# Altium schematic symbol library Sang_library.SchLib: 1607 symbols (part 12 of 15) (continued)
## STM32F103RDT6 - LQFP64 (continued)

## STM32F103RDT6 - LQFP64_1
designator STM?, comment STM32F103RDT6
Dán; Ma_Hang: MH004910; Ten_Linh_Kien: STM32F103RDT6 LQFP64; Don_Vi: Con; Kieu_Chan: *; Ghi_Chu: *; Chung_Loai: Dán
pins: 1 VBAT, 2 PC13/TAMPERRTC, 3 PC14/OSC32_IN[OSC32_IN], 4 PC15OSC32_OUT[OSC32_OUT], 5 OSC_IN, 6 OSC_OUT, 7 NRST, 8 PC0/ADC123_IN10, 9 PC1/ADC123_IN11, 10 PC2/ ADC123_IN12, 11 PC3/ADC123_IN13, 12 VSSA, 13 VDDA, 14 PA0-WKUP/WKUP/USART2_CTS/ADC123_IN0/TIM2_CH1_ETR/TIM5_CH1/TIM8_ETR, 15 PA1/USART2_RTS/ADC123_IN1/TIM5_CH2/TIM2_CH2, 16 PA2/USART2_TX(9)/TIM5_CH3/ADC123_IN2/TIM2_CH3, 17 PA3/USART2_RX/TIM5_CH4/ADC123_IN3/TIM2_CH4, 18 VSS_4, 19 VDD_4, 20 PA4/SPI1_NSS/USART2_CK/DAC_OUT1/ADC12_IN4, 21 PA5/SPI1_SCK/DAC_OUT2 ADC12_IN5 , 22 PA6/SPI1_MISO/TIM8_BKIN/ADC12_IN6/TIM3_CH1[TIM1_BKIN], 23 PA7/SPI1_MOSI/TIM8_CH1N/ADC12_IN7/TIM3_CH2[TIM1_CH1N], 24 PC4/ ADC12_IN14 , 25 PC5/ ADC12_IN15 , 26 PB0/ADC12_IN8/TIM3_CH3/TIM8_CH2N[TIM1_CH2N], 27 PB1/ADC12_IN9/TIM3_CH4/TIM8_CH3N[TIM1_CH3N], 28 PB2/BOOT1, 29 PB10/I2C2_SCL/USART3_TX[TIM2_CH3], 30 PB11/I2C2_SDA/USART3_RX[TIM2_CH4], 31 VSS_1, 32 VDD_1, 33 PB12/SPI2_NSS/I2S2_WS/I2C2_SMBA/USART3_CK/TIM1_BKIN, 34 PB13/SPI2_SCK/I2S2_CK/USART3_CTS/TIM1_CH1N, 35 PB14/SPI2_MISO/TIM1_CH2N/USART3_RTS, 36 PB15/SPI2_MOSI/I2S2_SD/TIM1_CH3N, 37 PC6/I2S2_MCK/TIM8_CH1/SDIO_D6[TIM3_CH1], 38 PC7/I2S3_MCK/TIM8_CH2/SDIO_D7[TIM3_CH2], 39 PC8/TIM8_CH3/SDIO_D0[TIM3_CH3], 40 PC9/ TIM8_CH4/SDIO_D1[TIM3_CH4], 41 PA8/USART1_CK/TIM1_CH1/MCO, 42 PA9/USART1_TX/TIM1_CH2, 43 PA10/USART1_RX/TIM1_CH3, 44 PA11/USART1_CTS/USBDM/CAN_RX/TIM1_CH4, 45 PA12/USART1_RTS/USBDP/CAN_TX/TIM1_ETR, 46 PA13/JTMSSWDIO[ PA13], 47 VSS_2, 48 VDD_2, 49 PA14/JTCKSWCLK[ PA14], 50 PA15/SPI3_NSS/I2S3_WS[TIM2_CH1_ETRPA15 / SPI1_NSS], 51 PC10/ UART4_TX/SDIO_D2[ USART3_TX], 52 PC11/UART4_RX/SDIO_D3[ USART3_RX], 53 PC12/ UART5_TX/SDIO_CK[ USART3_CK], 54 PD2/TIM3_ETR/UART5_RX/SDIO_CMD, 55 PB3/SPI3_SCK / I2S3_CK[PB3/TRACESWOTIM2_CH2 /SPI1_SCK], 56 PB4/ SPI3_MISO[PB4 / TIM3_CH1SPI1_MISO], 57 PB5/I2C1_SMBA/ SPI3_MOSI/I2S3_SD[TIM3_CH2 /SPI1_MOSI], 58 PB6/ I2C1_SCL/ TIM4_CH1[USART1_TX], 59 PB7/I2C1_SDA/FSMC_NADV /TIM4_CH2[USART1_RX], 60 BOOT0, 61 PB8/TIM4_CH3/SDIO_D4[I2C1_SCL/CAN_RX], 62 PB9/TIM4_CH4/SDIO_D5[I2C1_SDA /CAN_TX], 63 VSS_3, 64 VDD_3

## STM32F103T6U6
designator U?
STM32 ARM-based 32-bit MCU with 32 Kbytes Flash, 36-pin VFQFPN, Industrial Temperature; Published: 30-May-2008; DatasheetVersion: rev6, Mar-2008; PackageVersion: Mar-2008; PackageReference: VFQN36; Publisher: Altium Limited; PackageDescription: 36-Pin Quad Flat No-Lead, 6 x 6 X 1.0 mm Body, 0.5 mm Pitch, Exposed Pad (VFQN36); ComponentLink1Description: Manufacturer Link; ComponentLink1URL: www.st.com/stm32; ComponentLink2Description: Datasheet; ComponentLink2URL: http://www.st.com/stonline/products/literature/ds/13587.pdf
footprint QFN36 (QFN, 36-Leads, Body 6x6mm, Pitch 0.5mm, IPC High Density)
pins: 1 VDD_3 (power), 2 OSC_IN/PD0 (in), 3 OSC_OUT/PD1 (out), 4 NRST (io), 5 VSSA (power), 6 VDDA (power), 7 PA0-WKUP (io), 8 PA1 (io), 9 PA2 (io), 10 PA3 (io), 11 PA4 (io), 12 PA5 (io), 13 PA6 (io), 14 PA7 (io), 15 PB0 (io), 16 PB1 (io), 17 PB2/BOOT1 (io), 18 VSS_1 (power), 19 VDD_1 (power), 20 PA8 (io), 21 PA9 (io), 22 PA10 (io), 23 PA11 (io), 24 PA12 (io), 25 PA13/JTMS/SWDIO (io), 26 VSS_2 (power), 27 VDD_2 (power), 28 PA14/JTCK/SWCLK (io), 29 PA15/JTDI (io), 30 PB3/JTDO (io), 31 PB4/JNTRST (io), 32 PB5 (io), 33 PB6 (io), 34 PB7 (io), 35 BOOT0 (in), 36 VSS_3 (power)

## STM32F103VBH6
designator U?
STM32 ARM-based 32-bit MCU with 128 Kbytes Flash, 100-pin BGA, Industrial Temperature; Published: 30-May-2008; DatasheetVersion: rev6, Mar-2008; PackageVersion: Mar-2008; PackageReference: LFBGA100; Publisher: Altium Limited; PackageDescription: 100-Ball Low Profile Fine Pitch BGA, 10 x 10 x 1.7 mm Body, 0.8 mm Pitch (LFBGA100); ComponentLink1Description: Manufacturer Link; ComponentLink1URL: www.st.com/stm32; ComponentLink2Description: Datasheet; ComponentLink2URL: http://www.st.com/stonline/products/literature/ds/13587.pdf
footprint BGA100 (BGA, 100-Leads, Body 9x9mm, Pitch 0.8mm)
pins: A1 PC14-OSC32_IN (io), A2 PC13-TAMPER-RTC (io), A3 PE2 (io), A4 PB9 (io), A5 PB7 (io), A6 PB4/JNTRST (io), A7 PB3/JTDO (io), A8 PA15/JTDI (io), A9 PA14/JTCK/SWCLK (io), A10 PA13/JTMS/SWDIO (io), B1 PC15-OSC32_OUT (io), B2 VBAT (power), B3 PE3 (io), B4 PB8 (io), B5 PB6 (io), B6 PD5 (io), B7 PD2 (io), B8 PC11 (io), B9 PC10 (io), B10 PA12 (io), C1 OSC_IN (in), C2 VSS_5 (power), C3 PE4 (io), C4 PE1 (io), C5 PB5 (io), C6 PD6 (io), C7 PD3 (io), C8 PC12 (io), C9 PA9 (io), C10 PA11 (io), D1 OSC_OUT (out), D2 VDD_5 (power), D3 PE5 (io), D4 PE0 (io), D5 BOOT0 (in), D6 PD7 (io), D7 PD4 (io), D8 PD0 (io), D9 PA8 (io), D10 PA10 (io), E1 NRST (io), E2 PC2 (io), E3 PE6 (io), E4 VSS_4 (power), E5 VSS_3 (power), E6 VSS_2 (power), E7 VSS_1 (power), E8 PD1 (io), E9 PC9 (io), E10 PC7 (io), F1 PC0 (io), F2 PC1 (io), F3 PC3 (io), F4 VDD_4 (power), F5 VDD_3 (power), F6 VDD_2 (power), F7 VDD_1 (power), F8 NC, F9 PC8 (io), F10 PC6 (io), G1 VSSA (power), G2 PA0-WKUP (io), G3 PA4 (io), G4 PC4 (io), G5 PB2/BOOT1 (io), G6 PE10 (io), G7 PE14 (io), G8 PB15 (io), G9 PD11 (io), G10 PD15 (io), H1 VREF- (power), H2 PA1 (io), H3 PA5 (io), H4 PC5 (io), H5 PE7 (io), H6 PE11 (io), H7 PE15 (io), H8 PB14 (io), H9 PD10 (io), H10 PD14 (io), J1 VREF+ (power), J2 PA2 (io), J3 PA6 (io), J4 PB0 (io), J5 PE8 (io), J6 PE12 (io), J7 PB10 (io), J8 PB13 (io), J9 PD9 (io), J10 PD13 (io), K1 VDDA (power), K2 PA3 (io), K3 PA7 (io), K4 PB1 (io), K5 PE9 (io), K6 PE13 (io), K7 PB11 (io), K8 PB12 (io), K9 PD8 (io), K10 PD12 (io)

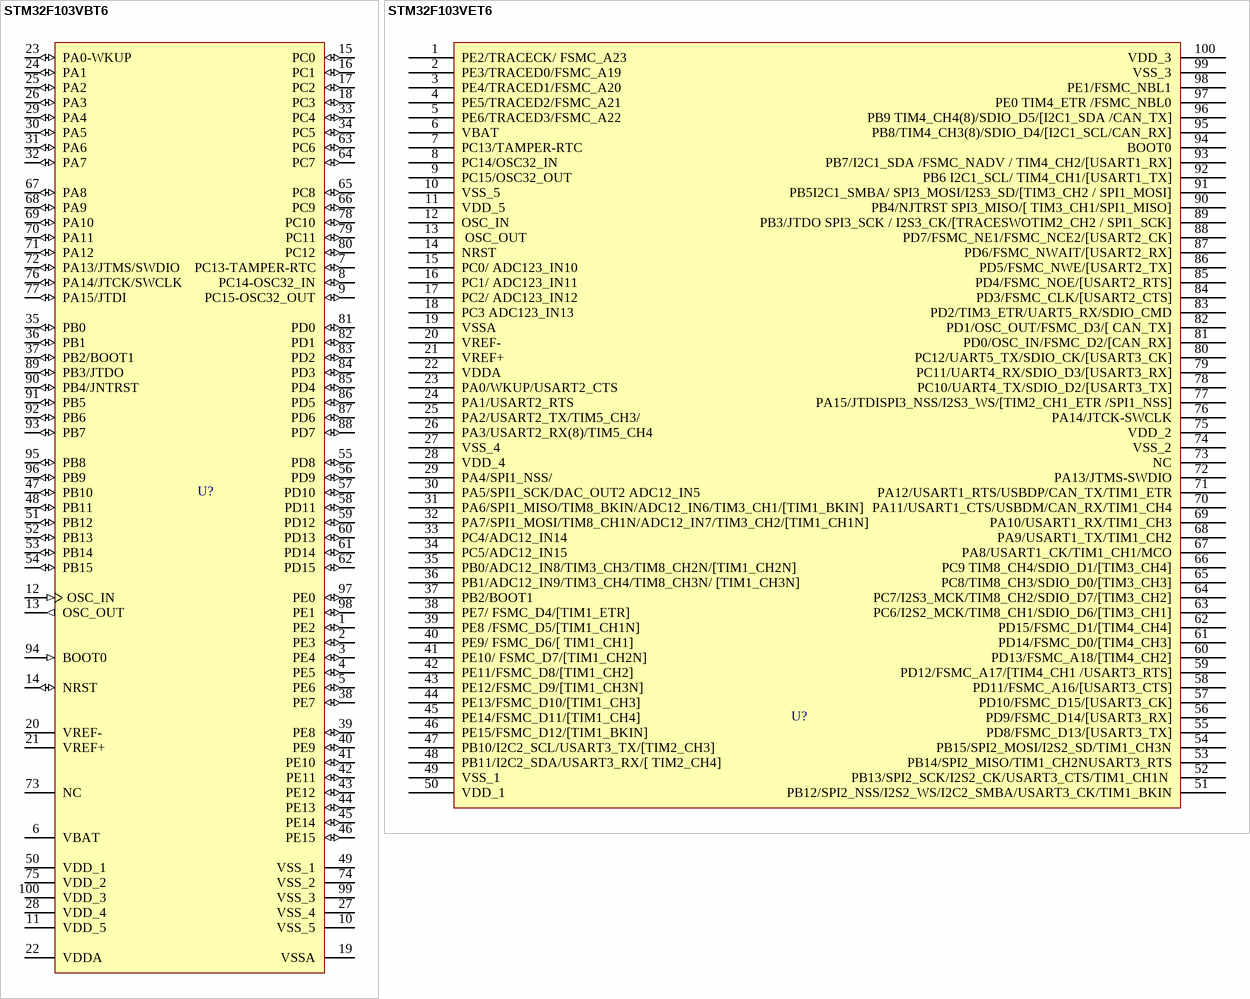
[diagram p80: symbols STM32F103VBT6 to STM32F103VET6]

## STM32F103VBT6
designator U?
STM32 ARM-based 32-bit MCU with 64 Kbytes Flash, 100-pin LQFP, Industrial Temperature; Published: 30-May-2008; DatasheetVersion: rev6, Mar-2008; PackageVersion: Mar-2008; PackageReference: LQFP100; Publisher: Altium Limited; PackageDescription: 100-Pin Low-Profile Quad Flat Pack, 14 x 14 mm Body, 0.5 mm Pitch (LQFP100); ComponentLink1Description: Manufacturer Link; ComponentLink1URL: www.st.com/stm32; ComponentLink2Description: Datasheet; ComponentLink2URL: http://www.st.com/stonline/products/literature/ds/13587.pdf
footprint TQFP100L (TQFP, 100-Leads, Body 14.00x14.00mm, Pitch 0.50mm, IPC High Density)
pins: 1 PE2 (io), 2 PE3 (io), 3 PE4 (io), 4 PE5 (io), 5 PE6 (io), 6 VBAT (power), 7 PC13-TAMPER-RTC (io), 8 PC14-OSC32_IN (io), 9 PC15-OSC32_OUT (io), 10 VSS_5 (power), 11 VDD_5 (power), 12 OSC_IN (in), 13 OSC_OUT (out), 14 NRST (io), 15 PC0 (io), 16 PC1 (io), 17 PC2 (io), 18 PC3 (io), 19 VSSA (power), 20 VREF- (power), 21 VREF+ (power), 22 VDDA (power), 23 PA0-WKUP (io), 24 PA1 (io), 25 PA2 (io), 26 PA3 (io), 27 VSS_4 (power), 28 VDD_4 (power), 29 PA4 (io), 30 PA5 (io), 31 PA6 (io), 32 PA7 (io), 33 PC4 (io), 34 PC5 (io), 35 PB0 (io), 36 PB1 (io), 37 PB2/BOOT1 (io), 38 PE7 (io), 39 PE8 (io), 40 PE9 (io), 41 PE10 (io), 42 PE11 (io), 43 PE12 (io), 44 PE13 (io), 45 PE14 (io), 46 PE15 (io), 47 PB10 (io), 48 PB11 (io), 49 VSS_1 (power), 50 VDD_1 (power), 51 PB12 (io), 52 PB13 (io), 53 PB14 (io), 54 PB15 (io), 55 PD8 (io), 56 PD9 (io), 57 PD10 (io), 58 PD11 (io), 59 PD12 (io), 60 PD13 (io), 61 PD14 (io), 62 PD15 (io), 63 PC6 (io), 64 PC7 (io), 65 PC8 (io), 66 PC9 (io), 67 PA8 (io), 68 PA9 (io), 69 PA10 (io), 70 PA11 (io), 71 PA12 (io), 72 PA13/JTMS/SWDIO (io), 73 NC, 74 VSS_2 (power), 75 VDD_2 (power), 76 PA14/JTCK/SWCLK (io), 77 PA15/JTDI (io), 78 PC10 (io), 79 PC11 (io), 80 PC12 (io), 81 PD0 (io), 82 PD1 (io), 83 PD2 (io), 84 PD3 (io), 85 PD4 (io), 86 PD5 (io), 87 PD6 (io), 88 PD7 (io), 89 PB3/JTDO (io), 90 PB4/JNTRST (io), 91 PB5 (io), 92 PB6 (io), 93 PB7 (io), 94 BOOT0 (in), 95 PB8 (io), 96 PB9 (io), 97 PE0 (io), 98 PE1 (io), 99 VSS_3 (power), 100 VDD_3 (power)

## STM32F103VET6
designator U?  (value not drawn)
Dán; Don_Vi: Con; Ma_Hang: MH001240; Ten_Linh_Kien: STM32F103VET6; Kieu_Chan: *; Ghi_Chu: *; Chung_Loai: Dán
footprint LQFP 100
pins: 1 PE2/TRACECK/ FSMC_A23, 2 PE3/TRACED0/FSMC_A19, 3 PE4/TRACED1/FSMC_A20, 4 PE5/TRACED2/FSMC_A21, 5 PE6/TRACED3/FSMC_A22, 6 VBAT, 7 PC13/TAMPER-RTC, 8 PC14/OSC32_IN, 9 PC15/OSC32_OUT, 10 VSS_5, 11 VDD_5, 12 OSC_IN, 13  OSC_OUT, 14 NRST, 15 PC0/ ADC123_IN10, 16 PC1/ ADC123_IN11, 17 PC2/ ADC123_IN12, 18 PC3 ADC123_IN13, 19 VSSA, 20 VREF-, 21 VREF+, 22 VDDA, 23 PA0/WKUP/USART2_CTS, 24 PA1/USART2_RTS, 25 PA2/USART2_TX/TIM5_CH3/, 26 PA3/USART2_RX(8)/TIM5_CH4, 27 VSS_4, 28 VDD_4, 29 PA4/SPI1_NSS/, 30 PA5/SPI1_SCK/DAC_OUT2 ADC12_IN5, 31 PA6/SPI1_MISO/TIM8_BKIN/ADC12_IN6/TIM3_CH1/[TIM1_BKIN], 32 PA7/SPI1_MOSI/TIM8_CH1N/ADC12_IN7/TIM3_CH2/[TIM1_CH1N], 33 PC4/ADC12_IN14 , 34 PC5/ADC12_IN15, 35 PB0/ADC12_IN8/TIM3_CH3/TIM8_CH2N/[TIM1_CH2N], 36 PB1/ADC12_IN9/TIM3_CH4/TIM8_CH3N/ [TIM1_CH3N], 37 PB2/BOOT1, 38 PE7/ FSMC_D4/[TIM1_ETR], 39 PE8 /FSMC_D5/[TIM1_CH1N], 40 PE9/ FSMC_D6/[ TIM1_CH1], 41 PE10/ FSMC_D7/[TIM1_CH2N], 42 PE11/FSMC_D8/[TIM1_CH2], 43 PE12/FSMC_D9/[TIM1_CH3N], 44 PE13/FSMC_D10/[TIM1_CH3], 45 PE14/FSMC_D11/[TIM1_CH4], 46 PE15/FSMC_D12/[TIM1_BKIN], 47 PB10/I2C2_SCL/USART3_TX/[TIM2_CH3], 48 PB11/I2C2_SDA/USART3_RX/[ TIM2_CH4], 49 VSS_1, 50 VDD_1, 51 PB12/SPI2_NSS/I2S2_WS/I2C2_SMBA/USART3_CK/TIM1_BKIN, 52 PB13/SPI2_SCK/I2S2_CK/USART3_CTS/TIM1_CH1N , 53 PB14/SPI2_MISO/TIM1_CH2NUSART3_RTS, 54 PB15/SPI2_MOSI/I2S2_SD/TIM1_CH3N, 55 PD8/FSMC_D13/[USART3_TX], 56 PD9/FSMC_D14/[USART3_RX], 57 PD10/FSMC_D15/[USART3_CK], 58 PD11/FSMC_A16/[USART3_CTS], 59 PD12/FSMC_A17/[TIM4_CH1 /USART3_RTS], 60 PD13/FSMC_A18/[TIM4_CH2], 61 PD14/FSMC_D0/[TIM4_CH3], 62 PD15/FSMC_D1/[TIM4_CH4], 63 PC6/I2S2_MCK/TIM8_CH1/SDIO_D6/[TIM3_CH1], 64 PC7/I2S3_MCK/TIM8_CH2/SDIO_D7/[TIM3_CH2], 65 PC8/TIM8_CH3/SDIO_D0/[TIM3_CH3], 66 PC9 TIM8_CH4/SDIO_D1/[TIM3_CH4], 67 PA8/USART1_CK/TIM1_CH1/MCO, 68 PA9/USART1_TX/TIM1_CH2, 69 PA10/USART1_RX/TIM1_CH3, 70 PA11/USART1_CTS/USBDM/CAN_RX/TIM1_CH4, 71 PA12/USART1_RTS/USBDP/CAN_TX/TIM1_ETR, 72 PA13/JTMS-SWDIO, 73 NC, 74 VSS_2, 75 VDD_2, 76 PA14/JTCK-SWCLK, 77 PA15/JTDISPI3_NSS/I2S3_WS/[TIM2_CH1_ETR /SPI1_NSS], 78 PC10/UART4_TX/SDIO_D2/[USART3_TX], 79 PC11/UART4_RX/SDIO_D3/[USART3_RX], 80 PC12/UART5_TX/SDIO_CK/[USART3_CK], 81 PD0/OSC_IN/FSMC_D2/[CAN_RX], 82 PD1/OSC_OUT/FSMC_D3/[ CAN_TX], 83 PD2/TIM3_ETR/UART5_RX/SDIO_CMD, 84 PD3/FSMC_CLK/[USART2_CTS], 85 PD4/FSMC_NOE/[USART2_RTS], 86 PD5/FSMC_NWE/[USART2_TX], 87 PD6/FSMC_NWAIT/[USART2_RX], 88 PD7/FSMC_NE1/FSMC_NCE2/[USART2_CK], 89 PB3/JTDO SPI3_SCK / I2S3_CK/[TRACESWOTIM2_CH2 / SPI1_SCK], 90 PB4/NJTRST SPI3_MISO/[ TIM3_CH1/SPI1_MISO], 91 PB5I2C1_SMBA/ SPI3_MOSI/I2S3_SD/[TIM3_CH2 / SPI1_MOSI], 92 PB6 I2C1_SCL/ TIM4_CH1/[USART1_TX], 93 PB7/I2C1_SDA /FSMC_NADV / TIM4_CH2/[USART1_RX], 94 BOOT0, 95 PB8/TIM4_CH3(8)/SDIO_D4/[I2C1_SCL/CAN_RX], 96 PB9 TIM4_CH4(8)/SDIO_D5/[I2C1_SDA /CAN_TX], 97 PE0 TIM4_ETR /FSMC_NBL0, 98 PE1/FSMC_NBL1, 99 VSS_3, 100 VDD_3

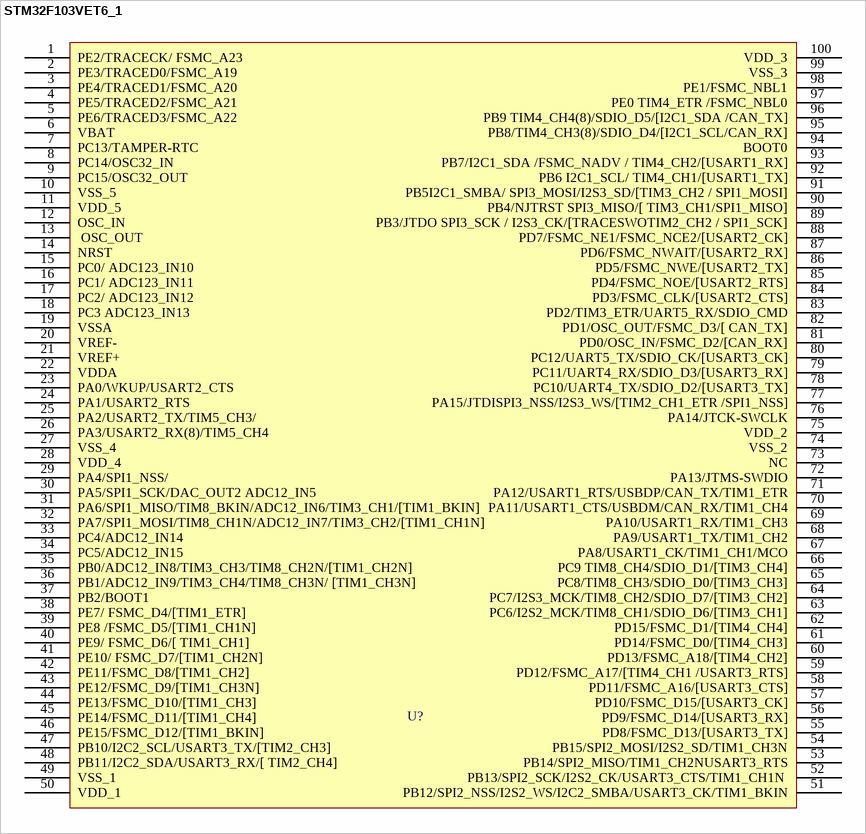
[diagram p81: symbol STM32F103VET6_1]

## STM32F103VET6_1
designator U?, comment STM32F103VET6  (value not drawn)
Dán; Don_Vi: Con; Ma_Hang: MH001240; Ten_Linh_Kien: STM32F103VET6; Kieu_Chan: *; Ghi_Chu: *; Chung_Loai: Dán
footprint LQFP 100
pins: 1 PE2/TRACECK/ FSMC_A23, 2 PE3/TRACED0/FSMC_A19, 3 PE4/TRACED1/FSMC_A20, 4 PE5/TRACED2/FSMC_A21, 5 PE6/TRACED3/FSMC_A22, 6 VBAT, 7 PC13/TAMPER-RTC, 8 PC14/OSC32_IN, 9 PC15/OSC32_OUT, 10 VSS_5, 11 VDD_5, 12 OSC_IN, 13  OSC_OUT, 14 NRST, 15 PC0/ ADC123_IN10, 16 PC1/ ADC123_IN11, 17 PC2/ ADC123_IN12, 18 PC3 ADC123_IN13, 19 VSSA, 20 VREF-, 21 VREF+, 22 VDDA, 23 PA0/WKUP/USART2_CTS, 24 PA1/USART2_RTS, 25 PA2/USART2_TX/TIM5_CH3/, 26 PA3/USART2_RX(8)/TIM5_CH4, 27 VSS_4, 28 VDD_4, 29 PA4/SPI1_NSS/, 30 PA5/SPI1_SCK/DAC_OUT2 ADC12_IN5, 31 PA6/SPI1_MISO/TIM8_BKIN/ADC12_IN6/TIM3_CH1/[TIM1_BKIN], 32 PA7/SPI1_MOSI/TIM8_CH1N/ADC12_IN7/TIM3_CH2/[TIM1_CH1N], 33 PC4/ADC12_IN14 , 34 PC5/ADC12_IN15, 35 PB0/ADC12_IN8/TIM3_CH3/TIM8_CH2N/[TIM1_CH2N], 36 PB1/ADC12_IN9/TIM3_CH4/TIM8_CH3N/ [TIM1_CH3N], 37 PB2/BOOT1, 38 PE7/ FSMC_D4/[TIM1_ETR], 39 PE8 /FSMC_D5/[TIM1_CH1N], 40 PE9/ FSMC_D6/[ TIM1_CH1], 41 PE10/ FSMC_D7/[TIM1_CH2N], 42 PE11/FSMC_D8/[TIM1_CH2], 43 PE12/FSMC_D9/[TIM1_CH3N], 44 PE13/FSMC_D10/[TIM1_CH3], 45 PE14/FSMC_D11/[TIM1_CH4], 46 PE15/FSMC_D12/[TIM1_BKIN], 47 PB10/I2C2_SCL/USART3_TX/[TIM2_CH3], 48 PB11/I2C2_SDA/USART3_RX/[ TIM2_CH4], 49 VSS_1, 50 VDD_1, 51 PB12/SPI2_NSS/I2S2_WS/I2C2_SMBA/USART3_CK/TIM1_BKIN, 52 PB13/SPI2_SCK/I2S2_CK/USART3_CTS/TIM1_CH1N , 53 PB14/SPI2_MISO/TIM1_CH2NUSART3_RTS, 54 PB15/SPI2_MOSI/I2S2_SD/TIM1_CH3N, 55 PD8/FSMC_D13/[USART3_TX], 56 PD9/FSMC_D14/[USART3_RX], 57 PD10/FSMC_D15/[USART3_CK], 58 PD11/FSMC_A16/[USART3_CTS], 59 PD12/FSMC_A17/[TIM4_CH1 /USART3_RTS], 60 PD13/FSMC_A18/[TIM4_CH2], 61 PD14/FSMC_D0/[TIM4_CH3], 62 PD15/FSMC_D1/[TIM4_CH4], 63 PC6/I2S2_MCK/TIM8_CH1/SDIO_D6/[TIM3_CH1], 64 PC7/I2S3_MCK/TIM8_CH2/SDIO_D7/[TIM3_CH2], 65 PC8/TIM8_CH3/SDIO_D0/[TIM3_CH3], 66 PC9 TIM8_CH4/SDIO_D1/[TIM3_CH4], 67 PA8/USART1_CK/TIM1_CH1/MCO, 68 PA9/USART1_TX/TIM1_CH2, 69 PA10/USART1_RX/TIM1_CH3, 70 PA11/USART1_CTS/USBDM/CAN_RX/TIM1_CH4, 71 PA12/USART1_RTS/USBDP/CAN_TX/TIM1_ETR, 72 PA13/JTMS-SWDIO, 73 NC, 74 VSS_2, 75 VDD_2, 76 PA14/JTCK-SWCLK, 77 PA15/JTDISPI3_NSS/I2S3_WS/[TIM2_CH1_ETR /SPI1_NSS], 78 PC10/UART4_TX/SDIO_D2/[USART3_TX], 79 PC11/UART4_RX/SDIO_D3/[USART3_RX], 80 PC12/UART5_TX/SDIO_CK/[USART3_CK], 81 PD0/OSC_IN/FSMC_D2/[CAN_RX], 82 PD1/OSC_OUT/FSMC_D3/[ CAN_TX], 83 PD2/TIM3_ETR/UART5_RX/SDIO_CMD, 84 PD3/FSMC_CLK/[USART2_CTS], 85 PD4/FSMC_NOE/[USART2_RTS], 86 PD5/FSMC_NWE/[USART2_TX], 87 PD6/FSMC_NWAIT/[USART2_RX], 88 PD7/FSMC_NE1/FSMC_NCE2/[USART2_CK], 89 PB3/JTDO SPI3_SCK / I2S3_CK/[TRACESWOTIM2_CH2 / SPI1_SCK], 90 PB4/NJTRST SPI3_MISO/[ TIM3_CH1/SPI1_MISO], 91 PB5I2C1_SMBA/ SPI3_MOSI/I2S3_SD/[TIM3_CH2 / SPI1_MOSI], 92 PB6 I2C1_SCL/ TIM4_CH1/[USART1_TX], 93 PB7/I2C1_SDA /FSMC_NADV / TIM4_CH2/[USART1_RX], 94 BOOT0, 95 PB8/TIM4_CH3(8)/SDIO_D4/[I2C1_SCL/CAN_RX], 96 PB9 TIM4_CH4(8)/SDIO_D5/[I2C1_SDA /CAN_TX], 97 PE0 TIM4_ETR /FSMC_NBL0, 98 PE1/FSMC_NBL1, 99 VSS_3, 100 VDD_3

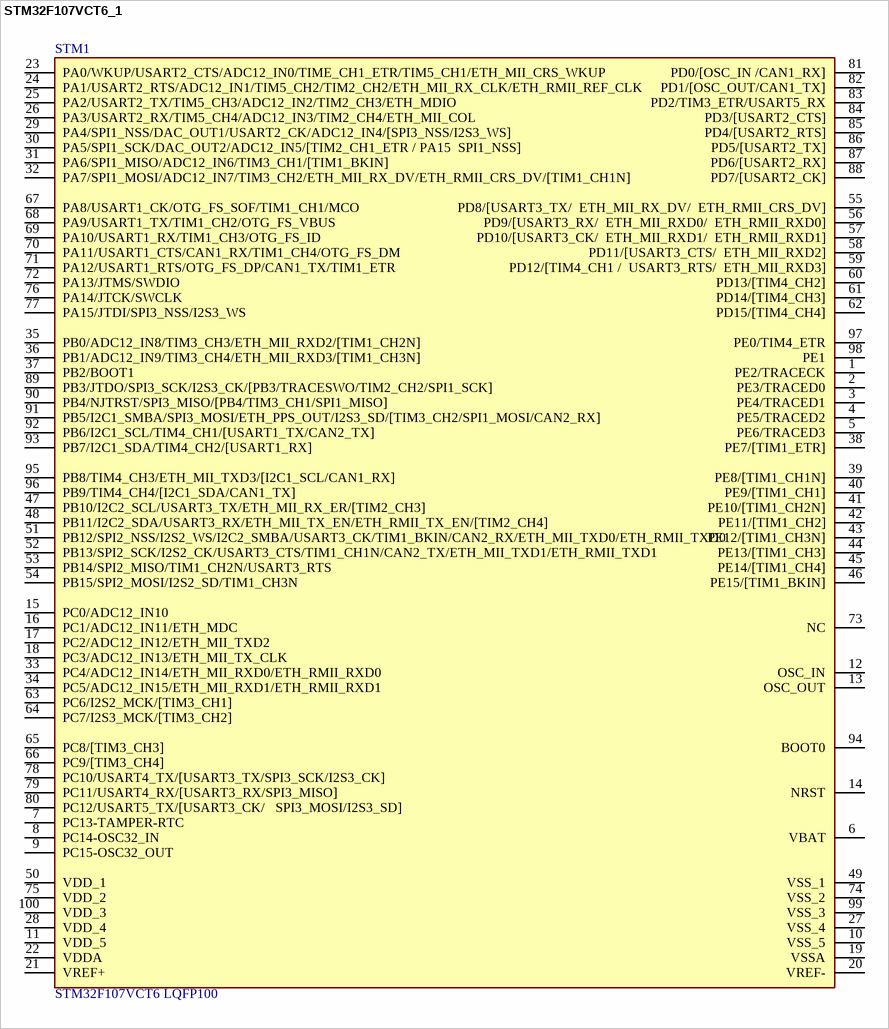
[diagram p82: symbol STM32F107VCT6_1]

## STM32F107VCT6_1
designator STM1, comment STM32F107VCT6 LQFP100
Dán; Don_Vi: Con; Ma_Hang: MH002437; Ten_Linh_Kien: STM32F107VCT6 LQFP100; Ghi_Chu: *; Kieu_Chan: *; Chung_Loai: Dán
footprint LQFP 100
pins: 1 PE2/TRACECK, 2 PE3/TRACED0, 3 PE4/TRACED1, 4 PE5/TRACED2, 5 PE6/TRACED3, 6 VBAT, 7 PC13-TAMPER-RTC, 8 PC14-OSC32_IN, 9 PC15-OSC32_OUT, 10 VSS_5, 11 VDD_5, 12 OSC_IN, 13 OSC_OUT, 14 NRST, 15 PC0/ADC12_IN10, 16 PC1/ADC12_IN11/ETH_MDC, 17 PC2/ADC12_IN12/ETH_MII_TXD2, 18 PC3/ADC12_IN13/ETH_MII_TX_CLK, 19 VSSA, 20 VREF-, 21 VREF+, 22 VDDA, 23 PA0/WKUP/USART2_CTS/ADC12_IN0/TIME_CH1_ETR/TIM5_CH1/ETH_MII_CRS_WKUP, 24 PA1/USART2_RTS/ADC12_IN1/TIM5_CH2/TIM2_CH2/ETH_MII_RX_CLK/ETH_RMII_REF_CLK, 25 PA2/USART2_TX/TIM5_CH3/ADC12_IN2/TIM2_CH3/ETH_MDIO, 26 PA3/USART2_RX/TIM5_CH4/ADC12_IN3/TIM2_CH4/ETH_MII_COL, 27 VSS_4, 28 VDD_4, 29 PA4/SPI1_NSS/DAC_OUT1/USART2_CK/ADC12_IN4/[SPI3_NSS/I2S3_WS], 30 PA5/SPI1_SCK/DAC_OUT2/ADC12_IN5/[TIM2_CH1_ETR / PA15  SPI1_NSS], 31 PA6/SPI1_MISO/ADC12_IN6/TIM3_CH1/[TIM1_BKIN], 32 PA7/SPI1_MOSI/ADC12_IN7/TIM3_CH2/ETH_MII_RX_DV/ETH_RMII_CRS_DV/[TIM1_CH1N], 33 PC4/ADC12_IN14/ETH_MII_RXD0/ETH_RMII_RXD0, 34 PC5/ADC12_IN15/ETH_MII_RXD1/ETH_RMII_RXD1, 35 PB0/ADC12_IN8/TIM3_CH3/ETH_MII_RXD2/[TIM1_CH2N], 36 PB1/ADC12_IN9/TIM3_CH4/ETH_MII_RXD3/[TIM1_CH3N], 37 PB2/BOOT1, 38 PE7/[TIM1_ETR], 39 PE8/[TIM1_CH1N], 40 PE9/[TIM1_CH1], 41 PE10/[TIM1_CH2N], 42 PE11/[TIM1_CH2], 43 PE12/[TIM1_CH3N], 44 PE13/[TIM1_CH3], 45 PE14/[TIM1_CH4], 46 PE15/[TIM1_BKIN], 47 PB10/I2C2_SCL/USART3_TX/ETH_MII_RX_ER/[TIM2_CH3], 48 PB11/I2C2_SDA/USART3_RX/ETH_MII_TX_EN/ETH_RMII_TX_EN/[TIM2_CH4], 49 VSS_1, 50 VDD_1, 51 PB12/SPI2_NSS/I2S2_WS/I2C2_SMBA/USART3_CK/TIM1_BKIN/CAN2_RX/ETH_MII_TXD0/ETH_RMII_TXD0, 52 PB13/SPI2_SCK/I2S2_CK/USART3_CTS/TIM1_CH1N/CAN2_TX/ETH_MII_TXD1/ETH_RMII_TXD1, 53 PB14/SPI2_MISO/TIM1_CH2N/USART3_RTS, 54 PB15/SPI2_MOSI/I2S2_SD/TIM1_CH3N, 55 PD8/[USART3_TX/  ETH_MII_RX_DV/  ETH_RMII_CRS_DV], 56 PD9/[USART3_RX/  ETH_MII_RXD0/  ETH_RMII_RXD0], 57 PD10/[USART3_CK/  ETH_MII_RXD1/  ETH_RMII_RXD1], 58 PD11/[USART3_CTS/  ETH_MII_RXD2], 59 PD12/[TIM4_CH1 /  USART3_RTS/  ETH_MII_RXD3], 60 PD13/[TIM4_CH2], 61 PD14/[TIM4_CH3], 62 PD15/[TIM4_CH4], 63 PC6/I2S2_MCK/[TIM3_CH1], 64 PC7/I2S3_MCK/[TIM3_CH2], 65 PC8/[TIM3_CH3], 66 PC9/[TIM3_CH4], 67 PA8/USART1_CK/OTG_FS_SOF/TIM1_CH1/MCO, 68 PA9/USART1_TX/TIM1_CH2/OTG_FS_VBUS, 69 PA10/USART1_RX/TIM1_CH3/OTG_FS_ID, 70 PA11/USART1_CTS/CAN1_RX/TIM1_CH4/OTG_FS_DM, 71 PA12/USART1_RTS/OTG_FS_DP/CAN1_TX/TIM1_ETR, 72 PA13/JTMS/SWDIO, 73 NC, 74 VSS_2, 75 VDD_2, 76 PA14/JTCK/SWCLK, 77 PA15/JTDI/SPI3_NSS/I2S3_WS, 78 PC10/USART4_TX/[USART3_TX/SPI3_SCK/I2S3_CK], 79 PC11/USART4_RX/[USART3_RX/SPI3_MISO], 80 PC12/USART5_TX/[USART3_CK/   SPI3_MOSI/I2S3_SD], 81 PD0/[OSC_IN /CAN1_RX], 82 PD1/[OSC_OUT/CAN1_TX], 83 PD2/TIM3_ETR/USART5_RX, 84 PD3/[USART2_CTS], 85 PD4/[USART2_RTS], 86 PD5/[USART2_TX], 87 PD6/[USART2_RX], 88 PD7/[USART2_CK], 89 PB3/JTDO/SPI3_SCK/I2S3_CK/[PB3/TRACESWO/TIM2_CH2/SPI1_SCK], 90 PB4/NJTRST/SPI3_MISO/[PB4/TIM3_CH1/SPI1_MISO], 91 PB5/I2C1_SMBA/SPI3_MOSI/ETH_PPS_OUT/I2S3_SD/[TIM3_CH2/SPI1_MOSI/CAN2_RX], 92 PB6/I2C1_SCL/TIM4_CH1/[USART1_TX/CAN2_TX], 93 PB7/I2C1_SDA/TIM4_CH2/[USART1_RX], 94 BOOT0, 95 PB8/TIM4_CH3/ETH_MII_TXD3/[I2C1_SCL/CAN1_RX], 96 PB9/TIM4_CH4/[I2C1_SDA/CAN1_TX], 97 PE0/TIM4_ETR, 98 PE1, 99 VSS_3, 100 VDD_3

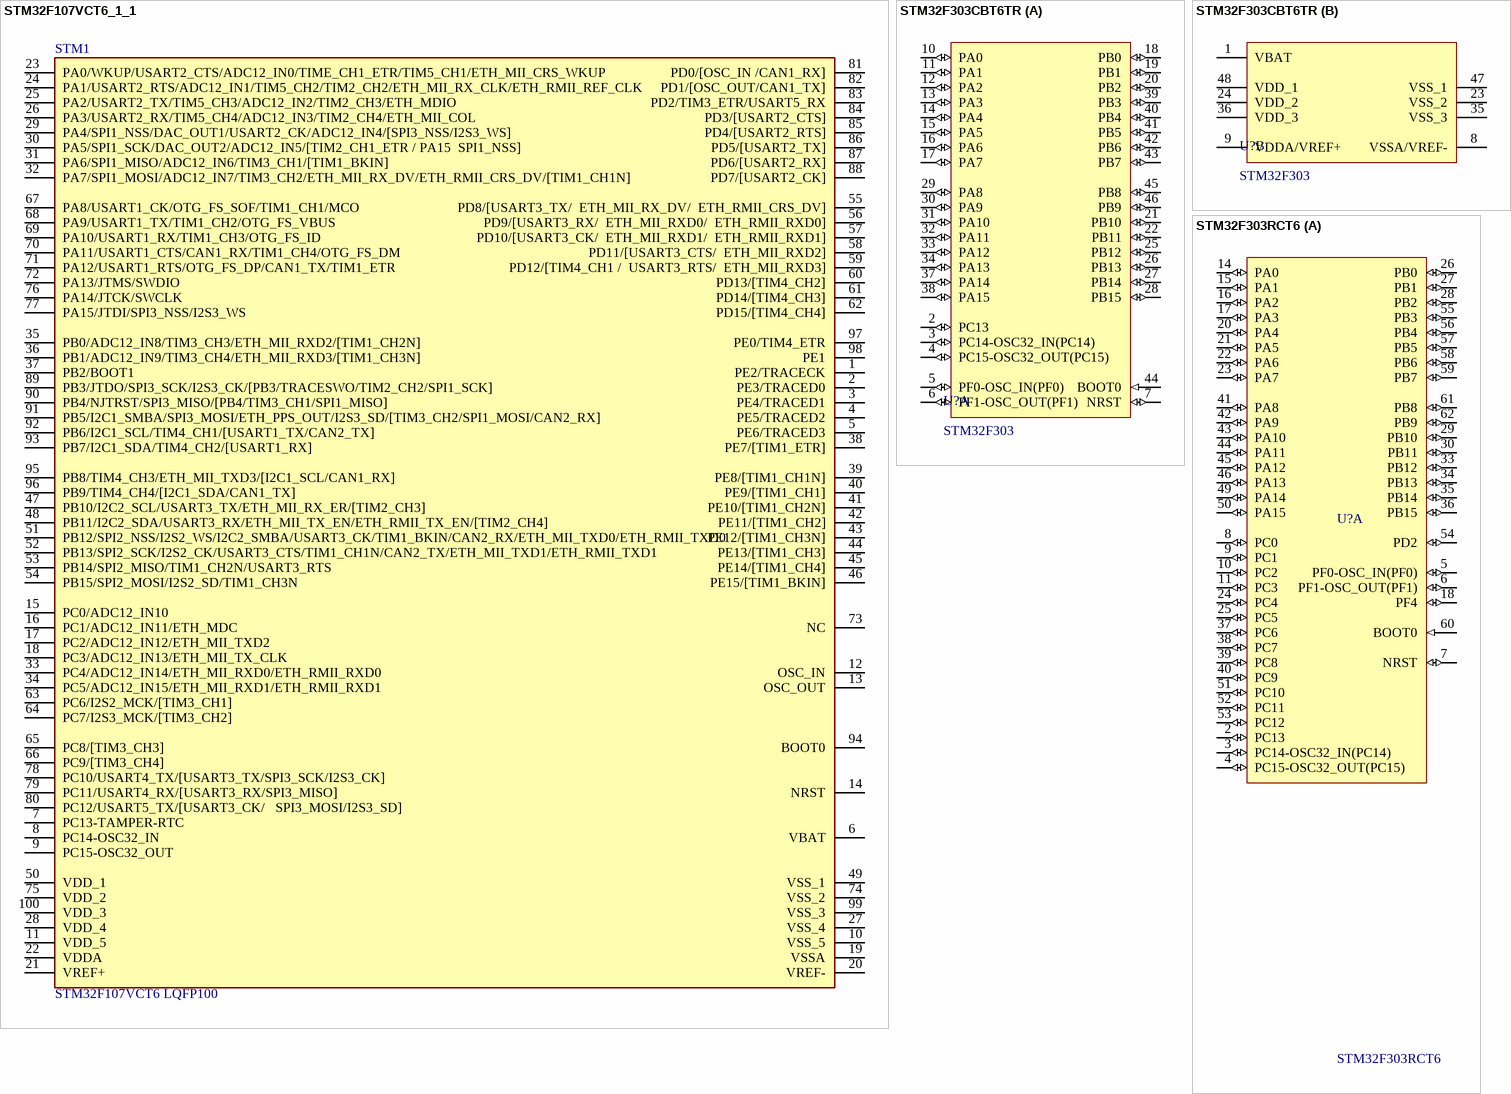
[diagram p83: symbols STM32F107VCT6_1_1 to STM32F303RCT6]